# Altium footprint library 二极管封装库.PcbLib: 222 footprints (part 12 of 14)
Each footprint in its own frame and in the unit in brackets; x right, y up, seen from the top. Pads: shape width x height; smd on the part's side, far side on the other; paste and mask are expansions set on the pad; w line width, h text height; cw(c..) or ccw(c..) is an arc to the next point about the centre after c.
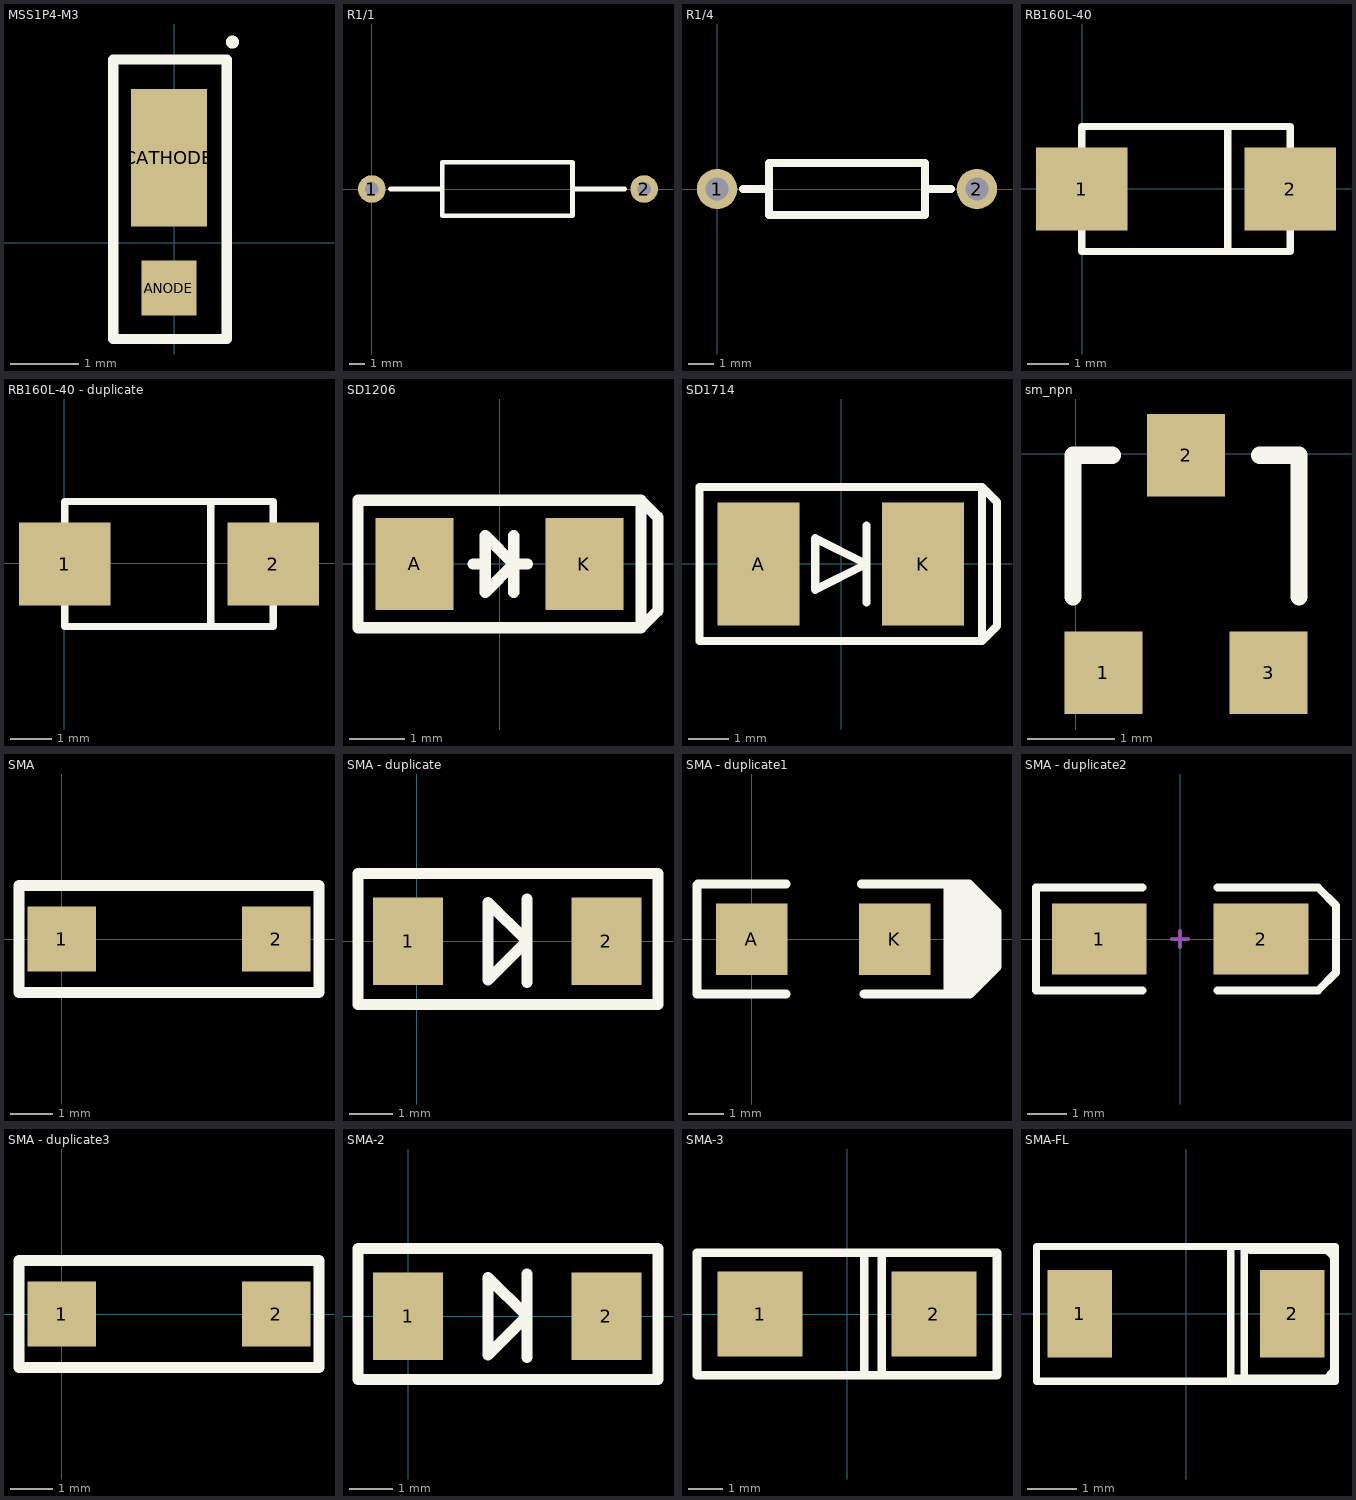
[diagram p11: the footprints below, top view; thin cyan lines are the x and y axes]

## MSS1P4-M3 [mm] "DIODE-SCHOTTKY_MSMP"
pads (2):
  rect 0.8x0.8 smd: ANODE(-0.078,-0.658)
  rect 1.1x2 smd: CATHODE(-0.078,1.242)
Top Overlay:
  circle w0.1: c0.844,2.921 r0.045
  lines w0.15: -0.889,-1.397 0.762,-1.397 0.762,2.667 -0.889,2.667 -0.889,-1.397
3D body "User Library-MicroSMP-2.STEP": height 0.73, standoff 0, extent -0.76,-0.79 0.64,1.91

## R1/1 [mm]
pads (2):
  round 1.8 hole 0.9: 1(0,0) 2(17.78,0)
Top Overlay:
  lines w0.305: 1.2,0 4.6,0 ; 4.6,-1.75 4.6,1.75 13.1,1.75 13.1,-1.75 4.7,-1.75 ; 13.1,0 16.5,0

## R1/4 [mil]
pads (2):
  round 62 hole 35.43: 1(0,0) 2(400,0)
Top Overlay:
  lines w12: 40,0 80,0 ; 320,0 360,0 ; 80,-40 80,40 320,40 320,-40 80,-40

## RB160L-40 [mm]
pads (2):
  rect 2.2x2 smd: 1(-0.014,-0.01) 2(4.986,-0.01)
Top Overlay:
  lines w0.178: -0.014,-1.01 -0.014,-1.51 4.986,-1.51 4.986,-1.01 ; -0.014,0.99 -0.014,1.49 4.986,1.49 4.986,0.99 ; 3.486,-1.51 3.486,1.49

## RB160L-40 - duplicate [mm]
pads (2):
  rect 2.2x2 smd: 1(0.019,-0.022) 2(5.019,-0.022)
Top Overlay:
  lines w0.178: 0.019,-1.022 0.019,-1.522 5.019,-1.522 5.019,-1.022 ; 0.019,0.978 0.019,1.478 5.019,1.478 5.019,0.978 ; 3.519,-1.522 3.519,1.478

## SD1206 [mil]
pads (2):
  rect 55x65 smd: A(-60.28,-0.01) K(59.72,-0.01)
Top Overlay:
  lines w7.87: 99.72,-45.01 111.72,-33.01 111.72,32.99 99.72,44.99
  lines w8: -18.78,-0.01 -10.28,-0.01 ; 9.72,-20.01 9.72,19.99 ; 19.42,-0.01 9.72,-0.01 ; 9.72,-0.01 -10.28,-20.01 -10.28,19.99 9.72,-0.01 ; -100.28,-45.01 -100.28,44.99 99.72,44.99 99.72,-45.01 -100.28,-45.01

## SD1714 [mil]
pads (2):
  rect 80x120 smd: A(-80.28,-0.01) K(79.72,-0.01)
Top Overlay:
  lines w7.87: 137.22,-75.01 151.72,-60.51 151.72,60.49 137.22,74.99
  lines w8: 24.72,-37.51 24.72,37.49 ; -137.78,-75.01 137.22,-75.01 137.22,74.99 -137.78,74.99 -137.78,-75.01 ; -25.28,-25.01 24.72,-0.01 -25.28,24.99 -25.28,-25.01

## sm_npn [mm]
pads (3):
  rect 0.9x0.95 smd: 1(0.32,-2.52) 2(1.27,-0.02) 3(2.22,-2.52)
Top Overlay:
  lines w0.2: -0.03,-1.645 -0.03,-0.02 0.42,-0.02 ; 2.12,-0.02 2.57,-0.02 2.57,-1.645

## SMA [mm]
pads (2):
  rect 1.63x1.53 smd: 1(0,0) 2(5.08,0)
Top Overlay:
  lines w0.254: -1.016,-1.27 6.096,-1.27 6.096,1.27 -1.016,1.27 -1.016,-1.27
3D body "DO-214AC.STEP": height 2.4, standoff 0, extent 0.24,-1.35 4.84,1.35

## SMA - duplicate [mil] "DO-214AC(2010)"
pads (2):
  rect 63x78.74 smd: 1(-8,0) 2(170.56,0)
Top Overlay:
  lines w10: 99,-37 99,38 ; -53,-57 217,-57 217,61 -53,61 -53,-57 ; 64,-35 99,0 64,35 64,-35
3D body "DO-214AC.STEP": height 94.49, standoff 0, extent -7.55,-52.15 173.55,54.15

## SMA - duplicate1 [mm]
pads (2):
  rect 2x2 smd: A(0,0) K(4,0)
Top Overlay:
  rectangle: 5.486,-1.473 6.147,1.524
  rectangle: 5.486,-1.295 6.379,1.241
  rectangle: 6.223,-1.118 6.625,0.995
  rectangle: 6.325,-0.61 6.858,0.762
  rectangle: 6.35,-0.762 6.858,-0.381
  lines w0.254: -1.524,1.524 -1.524,-1.524 0.965,-1.524 ; -1.499,1.549 0.965,1.549 ; 3.073,1.549 5.486,1.549 6.02,1.549 6.071,1.549 6.833,0.787 6.858,0.762 6.858,-0.762 6.147,-1.473 6.096,-1.524 5.486,-1.524 ; 3.15,-1.524 5.486,-1.524 ; 5.486,1.524 5.486,-1.524 ; 6.262,1.358 6.262,1.033 6.262,0.825 6.431,0.995 6.498,0.995 6.858,0.635 ; 6.579,-0.838 6.579,-0.61

## SMA - duplicate2 [mm] "DO-214-AC/SMA; 2 C-Bend Leads; Body 5 x 2.7 mm, inc. leads (LxW)"
height 2.44
pads (2):
  rect 2.4x1.8 smd: 1(-2.05,0) 2(2.05,0)
Top Overlay:
  lines w0.2: -0.95,-1.3 -3.65,-1.3 -3.65,1.3 -0.95,1.3 ; 0.95,-1.3 3.5,-1.3 3.95,-0.85 3.95,0.85 3.5,1.3 0.95,1.3
Mechanical 1:
  lines w0.1: -0.2,0 0.2,0 ; 0,-0.2 0,0.2

## SMA - duplicate3 [mm]
pads (2):
  rect 1.63x1.53 smd: 1(0,0) 2(5.08,0)
Top Overlay:
  lines w0.254: -1.016,-1.27 6.096,-1.27 6.096,1.27 -1.016,1.27 -1.016,-1.27
3D body "DO-214AC.STEP": height 2.4, standoff 0, extent 0.24,-1.35 4.84,1.35

## SMA-2 [mil]
pads (2):
  rect 63x78.74 smd: 1(0,0) 2(178.56,0)
Top Overlay:
  lines w10: 107,-37 107,38 ; -45,-57 -45,61 225,61 225,-57 -45,-57 ; 72,-35 72,35 107,0 72,-35

## SMA-3 [mm]
pads (2):
  rect 2.5x2.5 smd: 1(-2.55,0) 2(2.55,0)
Top Overlay:
  lines w0.25: 0.508,-1.8 0.508,1.8 ; 1.016,-1.8 1.016,1.8 ; -4.4,-1.8 -4.4,1.8 4.4,1.8 4.4,-1.8 -4.4,-1.8

## SMA-FL [mm]
pads (2):
  rect 1.3x1.76 smd: 1(-2.13,0) 2(2.13,0)
Top Overlay:
  lines w0.15: 0.898,-1.359 0.898,1.341 ; 0.952,-1.296 2.889,-1.296 ; 1.167,-1.359 1.167,1.313 ; 1.294,1.273 2.835,1.273 2.97,1.138 2.97,1.092 ; 2.792,-1.319 2.964,-1.147 2.964,1.237 ; -3,-1.35 -3,1.35 3,1.35 3,-1.35 -3,-1.35